# Altium footprint library 元件1.PcbLib: 420 footprints (part 2 of 27)
Each footprint in its own frame and in the unit in brackets; x right, y up, seen from the top. Pads: shape width x height; smd on the part's side, far side on the other; paste and mask are expansions set on the pad; w line width, h text height; cw(c..) or ccw(c..) is an arc to the next point about the centre after c.
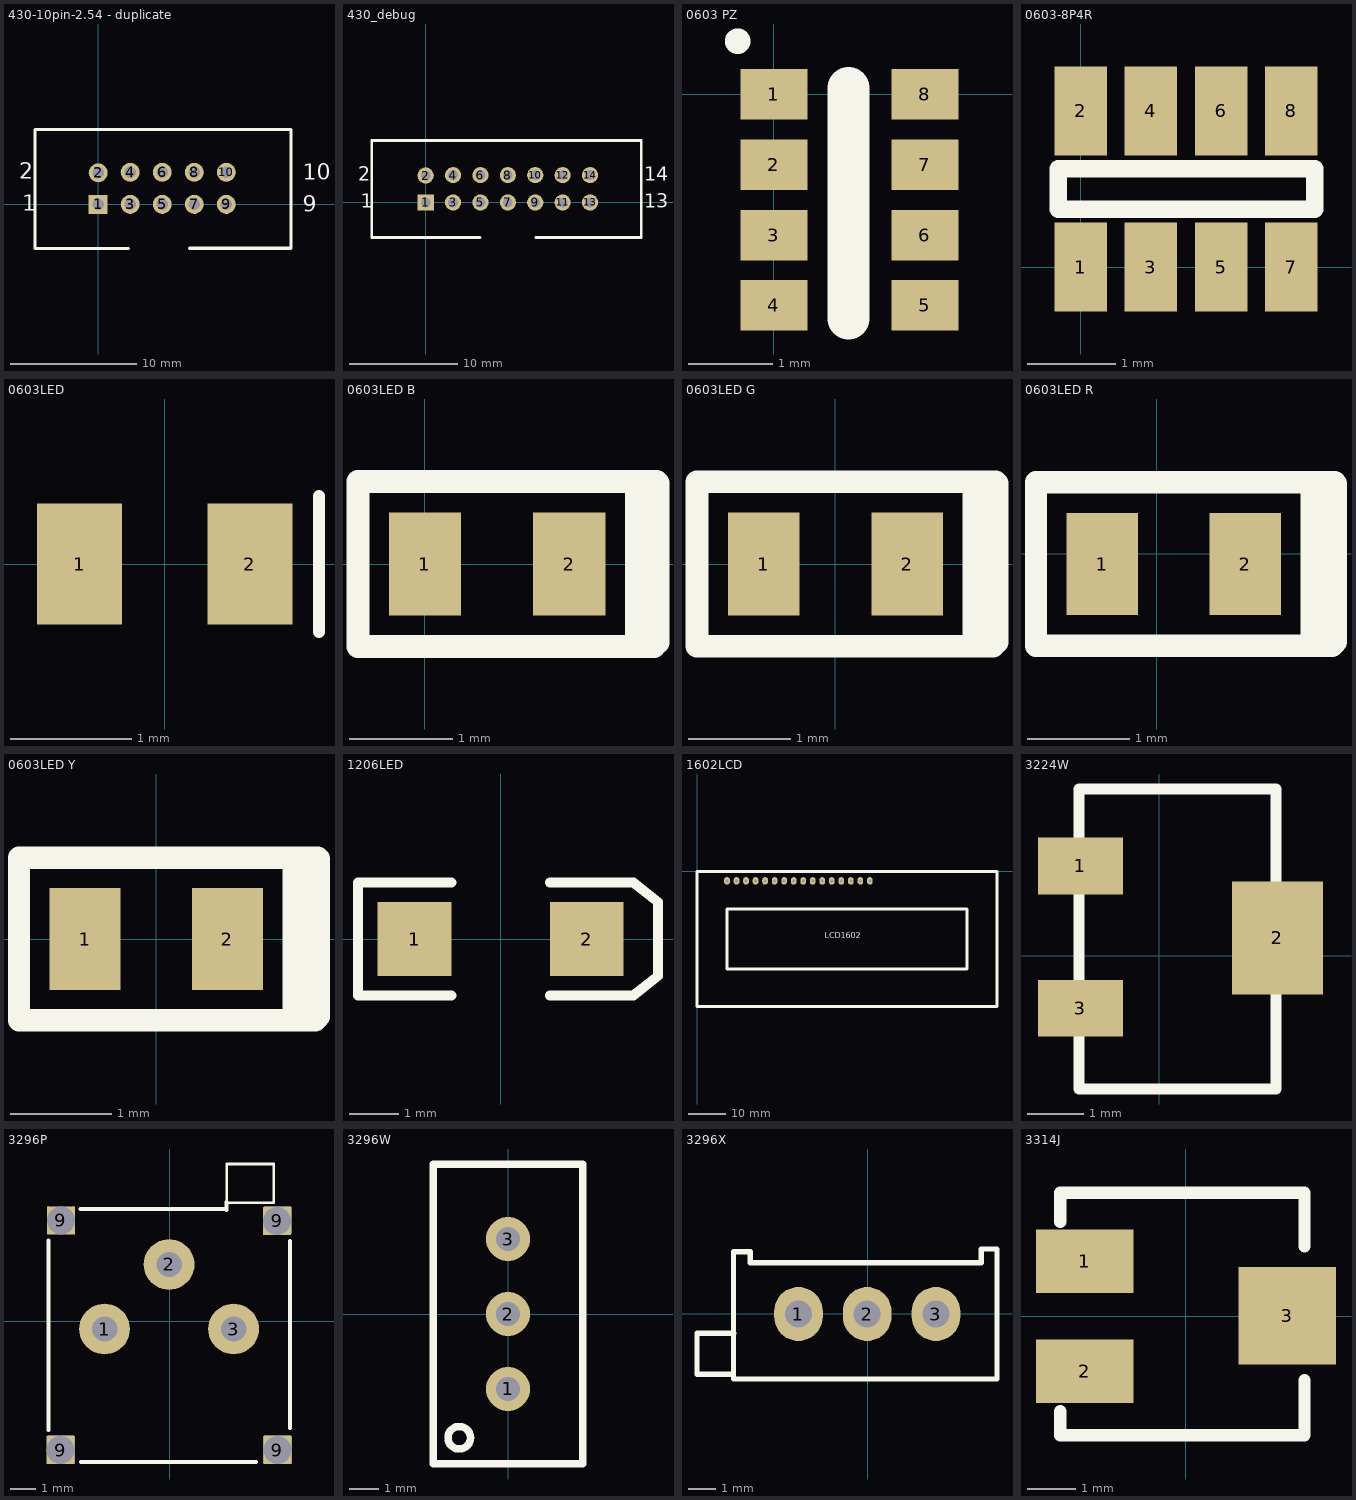
[diagram p1: the footprints below, top view; thin cyan lines are the x and y axes]

## 430-10pin-2.54 - duplicate [mm] "牛角座"
pads (10):
  rect 1.5x1.5 hole 0.9: 1(0,0)
  round 1.5 hole 0.9: 2(0,2.5) 3(2.54,0) 4(2.54,2.54) 5(5.08,0) 6(5.08,2.54) 7(7.62,0) 8(7.62,2.54) 9(10.16,0) 10(10.16,2.54)
Top Overlay:
  lines w0.254: 2.388,-3.505 -5,-3.505 -5,5.944 15.291,5.944 15.291,-3.48 7.264,-3.48
  text "2" at -6.274,2.032 h1.27
  text "1" at -6,-0.5 h1.27
  text "10" at 16.233,1.956 h1.27
  text "9" at 16.233,-0.584 h1.27
3D body "Header 2_54mm 10 Pin.step": height 9.86, standoff -3.05, extent -5.055,-3.353 15.265,5.791

## 430_debug [mm] "msp430调试接口（未加焊）"
pads (14):
  rect 1.5x1.5 hole 0.9: 1(0,0)
  round 1.5 hole 0.9: 2(0,2.5) 3(2.54,0) 4(2.54,2.54) 5(5.08,0) 6(5.08,2.54) 7(7.62,0) 8(7.62,2.54) 9(10.16,0) 10(10.16,2.54) 11(12.7,0) 12(12.7,2.54) 13(15.24,0) 14(15.24,2.54)
Top Overlay:
  lines w0.254: 5.028,-3.25 -5,-3.25 -5,5.75 20,5.75 20,-3.25 10.212,-3.25
  text "13" at 20.272,-0.508 h1.27
  text "14" at 20.272,2.032 h1.27
  text "1" at -6,-0.5 h1.27
  text "2" at -6.274,2.032 h1.27
3D body "430_debug_n.stp": height 8.67, standoff -3.41, extent -5.05,-3.295 20.29,5.545

## 0603 PZ [mm]
pads (8):
  rect 0.8x0.6 smd: 1(0,0) 2(0,-0.838) 3(0,-1.676) 4(0,-2.514) 5(1.8,-2.514) 6(1.8,-1.676) 7(1.8,-0.838) 8(1.8,0)
Top Overlay:
  circle w0.254: c-0.432,0.635 r0.025
  lines w0.5: 0.889,-2.667 0.889,0.076
3D body "User Library-TC164.STEP": height 0.55, standoff 0, extent 0.089,-2.87 1.689,0.33

## 0603-8P4R [mm]
pads (8):
  rect 0.6x1.016 smd: 1(0,0) 2(0,1.778) 3(0.8,0) 4(0.8,1.778) 5(1.6,0) 6(1.6,1.778) 7(2.4,0) 8(2.4,1.778)
Top Overlay:
  lines w0.2: -0.254,0.66 -0.254,1.118 2.667,1.118 2.667,0.66 -0.254,0.66
3D body "R1206-4R1-1.step": height 0.59, standoff 0.01, extent -0.381,0.102 2.819,1.702

## 0603LED [mm]
pads (2):
  rect 0.7x1 smd: 1(-0.7,0) 2(0.7,0)
Top Overlay:
  lines w0.1: 1.27,-0.559 1.27,0.559
3D body "User Library-led_0603LED0603 orange.STEP": height 0.6, standoff 0, extent -0.81,-0.4 0.81,0.4

## 0603LED B [mm]
pads (2):
  rect 0.7x1 smd: 1(0,0) 2(1.4,0)
Top Overlay:
  lines w0.22: 2.248,0.8 2.05,0.8 ; 2.261,0.787 2.261,-0.762 2.223,-0.8 2.05,-0.8 ; 2.05,-0.8 2.05,0.8 ; 2.05,-0.8 -0.65,-0.8 -0.65,0.8 2.05,0.8 ; 2.083,-0.457 2.083,0.66 2.083,-0.457
3D body "User Library-led_0603LED0603 blue.STEP": height 0.6, standoff 0, extent -0.099,-0.4 1.521,0.4

## 0603LED G [mm]
pads (2):
  rect 0.7x1 smd: 1(-0.7,0) 2(0.7,0)
Top Overlay:
  lines w0.22: 1.562,0.8 1.364,0.8 1.364,-0.8 1.537,-0.8 1.575,-0.762 1.575,0.787 ; -1.35,-0.8 1.35,-0.8 1.35,0.8 -1.35,0.8 -1.35,-0.8 ; 1.397,-0.457 1.397,0.66 1.397,-0.457
3D body "User Library-led_0603LED0603 green.STEP": height 0.6, standoff 0, extent -0.81,-0.4 0.81,0.4

## 0603LED R [mm]
pads (2):
  rect 0.7x1 smd: 1(-0.533,-0.102) 2(0.867,-0.102)
Top Overlay:
  lines w0.22: 1.528,-0.902 1.528,0.698 ; 1.74,0.698 1.542,0.698 1.542,-0.902 1.715,-0.902 1.753,-0.864 1.753,0.686 ; -1.183,-0.902 -1.183,0.698 1.517,0.698 1.517,-0.902 -1.183,-0.902 ; 1.575,-0.559 1.575,0.559 1.575,-0.559
3D body "User Library-led_0603.STEP": height 0.6, standoff 0, extent -0.632,-0.501 0.988,0.299

## 0603LED Y [mm]
pads (2):
  rect 0.7x1 smd: 1(-0.7,0) 2(0.7,0)
Top Overlay:
  lines w0.22: 1.364,-0.8 1.364,0.8 ; 1.375,-0.8 1.375,0.8 ; 1.588,0.8 1.39,0.8 1.39,-0.8 1.562,-0.8 1.6,-0.762 1.6,0.787 ; -1.35,-0.8 1.35,-0.8 1.35,0.8 -1.35,0.8 -1.35,-0.8 ; 1.422,-0.457 1.422,0.66 1.422,-0.457
3D body "User Library-led_0603LED0603 orange.STEP": height 0.6, standoff 0, extent -0.81,-0.4 0.81,0.4

## 1206LED [mm] "SMT LED; 2 Flat Leads"
height 1.2
pads (2):
  rect 1.5x1.5 smd: 1(-1.75,0) 2(1.75,0)
Top Overlay:
  lines w0.2: -1,-1.15 -2.9,-1.15 -2.9,1.15 -1,1.15 ; 1,-1.15 2.7,-1.15 3.2,-0.75 3.2,0.75 2.7,1.15 1,1.15
3D body "smtled1.STEP": height 1.5, standoff 0, extent -2.7,-1.016 2.7,0.984

## 1602LCD [mil] "LCD module 16*2 char"
pads (16):
  oval 60x80 hole 30: 1(314.96,-98.43) 2(414.96,-98.43) 3(514.96,-98.43) 4(614.96,-98.43) 5(714.96,-98.43) 6(814.96,-98.43) 7(914.96,-98.43) 8(1014.96,-98.43) 9(1114.96,-98.43) 10(1214.96,-98.43) 11(1314.96,-98.43) 12(1414.96,-98.43) 13(1514.96,-98.43) 14(1614.96,-98.43) 15(1714.96,-98.43) 16(1814.96,-98.43)
Top Overlay:
  lines w30: 0,-1417.32 3149.61,-1417.32 3149.61,0 0,0 0,-1417.32 ; 314.96,-1023.62 2834.65,-1023.62 2834.65,-393.7 314.96,-393.7 314.96,-1023.62
  text "LCD1602" at 1340,-700 h60
3D body "1602LCD.STEP": height 354.33, standoff -145.67, extent -5.8,-1401.95 3143.8,-24

## 3224W [mm]
pads (3):
  rect 1.5x1 smd: 1(-1.397,1.583) 3(-1.397,-0.932)
  rect 1.6x2 smd: 2(2.083,0.313)
Top Overlay:
  lines w0.2: -1.422,-2.354 2.057,-2.354 2.057,2.942 -1.422,2.942 -1.422,-2.354
Mechanical 2:
  text "+" at -0.203,0.63 h0.76
3D body "3224W.stp": height 5.29, standoff 0, extent -1.627,-2.134 2.311,2.692

## 3296P [mm]
pads (7):
  round 2 hole 1: 1(-2.558,-0.302) 2(-0.018,2.238) 3(2.522,-0.302)
  rect 1.1x1.1 hole 1.1 square: 9(-4.285,-5.066) 9(-4.28,3.97) 9(4.237,3.952) 9(4.243,-5.066)
Top Overlay:
  lines w0.1: -4.783,4.461 -4.783,3.481 -3.783,3.481 -3.783,4.461 ; 2.254,4.673 3.254,4.673 ; -4.783,-5.569 -3.783,-5.569 -3.783,-4.549 -4.783,-4.549 -4.783,-5.569 ; 2.246,4.673 4.111,4.673 4.111,6.193 2.246,6.193 2.246,4.673 ; 3.747,-5.569 4.747,-5.569 4.747,-4.549 3.747,-4.549 3.747,-5.569 ; 3.747,3.481 4.747,3.481 4.747,4.461 3.747,4.461 3.747,3.481
  lines w0.152: -4.765,-4.285 -4.765,3.184 ; -3.504,4.424 2.233,4.424 ; -3.481,-5.538 3.416,-5.538 ; 2.24,4.39 2.24,4.699 ; 4.745,-4.208 4.745,3.168
Mechanical 11:
  circle w0.1: c-2.558,-0.339 r0.25
  circle w0.1: c2.522,-0.339 r0.25
  circle w0.1: c-0.018,2.201 r0.25
3D body "User Library-3296P-K.STEP": height 5.4, standoff -1.5, extent -4.782,-5.569 4.747,5.981

## 3296W [mm]
height 2.38
pads (3):
  round 1.5 hole 0.8: 1(0,-2.54) 2(0,0) 3(0,2.54)
Top Overlay:
  circle w0.254: c-1.651,-4.191 r0.381
  lines w0.254: -2.54,-5.08 -2.54,5.08 2.54,5.08 2.54,-5.08 -2.54,-5.08
3D body "3296 pot.step": height 11.55, standoff -6.4, extent -2.413,-4.765 2.418,4.765

## 3296X [mm]
pads (3):
  oval 1.8x2 hole 1: 1(-2.561,-0.001) 2(-0.021,-0.001) 3(2.519,-0.001)
Top Overlay:
  lines w0.2: -5.031,-2.234 -6.309,-2.234 -6.309,-0.717 -4.959,-0.717 ; -4.962,-2.401 -3.821,-2.401 3.779,-2.401 4.775,-2.401 4.775,2.399 4.187,2.399 4.187,1.899 2.819,1.899 2.219,1.899 0.279,1.899 -0.321,1.899 -2.261,1.899 -2.861,1.899 -4.339,1.899 -4.339,2.299 -4.962,2.299 -4.962,-2.401
Mechanical 11:
  circle w0.1: c2.519,0.009 r0.25
  circle w0.1: c-0.021,0.009 r0.25
  circle w0.1: c-2.561,0.009 r0.25
3D body "User Library-Bourns - Trimpot 3296X.STEP": height 10.03, standoff -2.22, extent -6.301,-2.425 4.749,2.405

## 3314J [mm]
pads (3):
  rect 2x1.3 smd: 1(-2.072,1.124) 2(-2.072,-1.124)
  rect 2x2 smd: 3(2.072,0.007)
Top Overlay:
  lines w0.254: -2.578,-1.95 -2.578,-2.436 2.427,-2.436 2.427,-1.31 ; -2.578,1.93 -2.578,2.528 2.427,2.528 2.427,1.429
3D body "3314J.stp": height 2.67, standoff -0.06, extent -2.54,-2.423 2.464,2.576